# Altium footprint library Inductors.PcbLib: 70 footprints (part 5 of 5)
Each footprint in its own frame and in the unit in brackets; x right, y up, seen from the top. Pads: shape width x height; smd on the part's side, far side on the other; paste and mask are expansions set on the pad; w line width, h text height; cw(c..) or ccw(c..) is an arc to the next point about the centre after c.
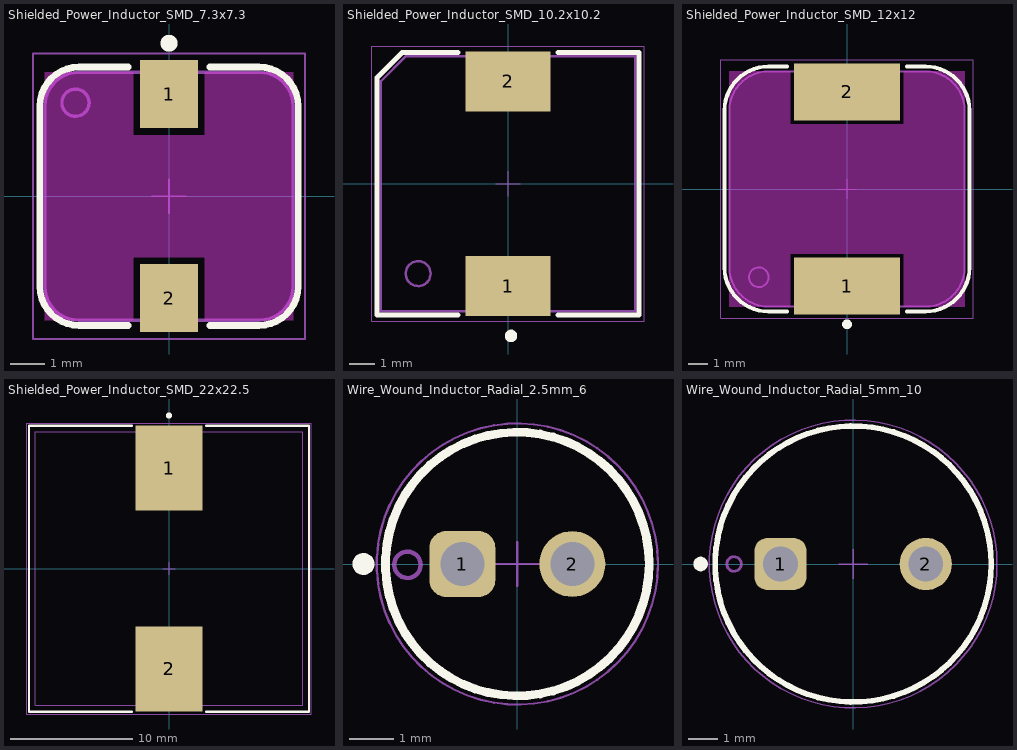
[diagram p4: the footprints below, top view; thin cyan lines are the x and y axes]

## Shielded_Power_Inductor_SMD_7.3x7.3 [mm]
height 3.2
pads (2):
  rect 1.7x2 smd: 1(0,3) 2(0,-3)
Top Layer keep-out:
  region: 3.65,-3.65 1.05,-3.65 1.05,-1.8 -1.05,-1.8 -1.05,-3.65 -3.65,-3.65 -3.65,3.65 -1.05,3.65 -1.05,1.8 1.05,1.8 1.05,3.65 3.65,3.65
Top Overlay:
  circle w0.25: c0,4.5 r0.125
  lines w0.2: -1.2,-3.8 -2.65,-3.8 cw(c-2.65,-2.65) -3.8,-2.65 -3.8,2.65 cw(c-2.65,2.65) -2.65,3.8 -1.2,3.8 ; 1.2,-3.8 2.65,-3.8 ccw(c2.65,-2.65) 3.8,-2.65 3.8,2.65 ccw(c2.65,2.65) 2.65,3.8 1.2,3.8
Top Component Outline:
  circle w0.1: c-2.75,2.75 r0.4
  lines w0.1: -3.65,-2.65 ccw(c-2.65,-2.65) -2.65,-3.65 2.65,-3.65 ccw(c2.65,-2.65) 3.65,-2.65 3.65,2.65 ccw(c2.65,2.65) 2.65,3.65 -2.65,3.65 ccw(c-2.65,2.65) -3.65,2.65 -3.65,-2.65
Top 3D Body:
  circle w0.1: c-2.75,2.75 r0.4
  lines w0.1: -3.65,-2.65 ccw(c-2.65,-2.65) -2.65,-3.65 2.65,-3.65 ccw(c2.65,-2.65) 3.65,-2.65 3.65,2.65 ccw(c2.65,2.65) 2.65,3.65 -2.65,3.65 ccw(c-2.65,2.65) -3.65,2.65 -3.65,-2.65
Top Courtyard:
  lines w0.05: -0.5,0 0.5,0 ; 0,-0.5 0,0.5 ; -4,-4.2 -4,4.2 4,4.2 4,-4.2 -4,-4.2
3D body "WE-PD_7332_p-base_7447789xx.stp": height 3.22, standoff 0.02, extent -3.65,-3.65 3.65,3.65

## Shielded_Power_Inductor_SMD_10.2x10.2 [mm]
height 6.4
pads (2):
  rect 3.4x2.4 smd: 1(0,-4.1) 2(0,4.1)
Top Overlay:
  circle w0.25: c0.12,-6.096 r0.125
  lines w0.2: -2,-5.25 -5.25,-5.25 -5.25,4.25 -4.25,5.25 -2,5.25 ; 2,-5.25 5.25,-5.25 5.25,5.25 2,5.25
Top Component Outline:
  circle w0.1: c-3.6,-3.6 r0.5
  lines w0.1: -5.1,-5.1 5.1,-5.1 5.1,5.1 -4.1,5.1 -5.1,4.1 -5.1,-5.1
Top 3D Body:
  circle w0.1: c-3.6,-3.6 r0.5
  lines w0.1: -5.1,-5.1 5.1,-5.1 5.1,5.1 -4.1,5.1 -5.1,4.1 -5.1,-5.1
Top Courtyard:
  lines w0.05: -0.5,0 0.5,0 ; 0,-0.5 0,0.5 ; -5.45,-5.5 -5.45,5.5 5.45,5.5 5.45,-5.5 -5.45,-5.5
3D body "7447798xxx.stp": height 6.4, standoff 0, extent -5.1,-5.1 5.1,5.1

## Shielded_Power_Inductor_SMD_12x12 [mm]
height 6
pads (2):
  rect 5.4x2.9 smd: 1(0,-4.95) 2(0,4.95)
Top Layer keep-out:
  region: -6,6 -2.9,6 -2.9,3.3 2.9,3.3 2.9,6 6,6 6,-6 2.9,-6 2.9,-3.3 -2.9,-3.3 -2.9,-6 -6,-6
Top Overlay:
  circle w0.25: c0,-6.9 r0.125
  lines w0.2: -3.05,-6.25 -4,-6.25 cw(c-4,-4) -6.25,-4 -6.25,4 cw(c-4,4) -4,6.25 -3.05,6.25 ; 3.05,-6.25 4,-6.25 ccw(c4,-4) 6.25,-4 6.25,4 ccw(c4,4) 4,6.25 3.05,6.25
Top Component Outline:
  circle w0.1: c-4.5,-4.5 r0.5
  lines w0.1: -6,-4 ccw(c-4,-4) -4,-6 4,-6 ccw(c4,-4) 6,-4 6,4 ccw(c4,4) 4,6 -4,6 ccw(c-4,4) -6,4 -6,-4
Top 3D Body:
  circle w0.1: c-4.5,-4.5 r0.5
  lines w0.1: -6,-4 ccw(c-4,-4) -4,-6 4,-6 ccw(c4,-4) 6,-4 6,4 ccw(c4,4) 4,6 -4,6 ccw(c-4,4) -6,4 -6,-4
Top Courtyard:
  lines w0.05: -0.5,0 0.5,0 ; 0,-0.5 0,0.5 ; -6.45,-6.6 -6.45,6.6 6.45,6.6 6.45,-6.6 -6.45,-6.6
3D body "WE-PD_1260_m-base_744771xxx.stp": height 5.66, standoff 0, extent -6,-6 6,6

## Shielded_Power_Inductor_SMD_22x22.5 [mm]
height 12
pads (2):
  rect 5.5x7 smd: 1(0,8.25) 2(0,-8.25)
Top Overlay:
  circle w0.25: c-0.007,12.573 r0.125
  lines w0.2: -3.05,-11.75 -11.5,-11.75 -11.5,11.75 -3.05,11.75 ; 3.05,-11.75 11.5,-11.75 11.5,11.75 3.05,11.75
Top Component Outline:
  lines w0.1: -11,-11.25 11,-11.25 11,11.25 -11,11.25 -11,-11.25
Top 3D Body:
  lines w0.1: -11,-11.25 11,-11.25 11,11.25 -11,11.25 -11,-11.25
Top Courtyard:
  lines w0.05: -0.5,0 0.5,0 ; 0,-0.5 0,0.5 ; -11.7,-11.95 -11.7,11.95 11.7,11.95 11.7,-11.95 -11.7,-11.95
3D body "7443558xxxx.stp": height 12, standoff 0, extent -11,-11.25 11,11.25

## Wire_Wound_Inductor_Radial_2.5mm_6 [mm]
height 8.5
pads (2):
  rrect50% 1.5x1.5 hole 1: 1(-1.25,0)
  round 1.5 hole 1: 2(1.25,0)
Top Overlay:
  circle w0.2: c0,0 r3
  circle w0.25: c-3.5,0 r0.125
Top Component Center:
  lines w0.05: -0.5,0 0.5,0 ; 0,-0.5 0,0.5
Top Component Outline:
  circle w0.1: c-2.5,-0.019 r0.3
  circle w0.1: c0,0 r3
Top Courtyard:
  circle w0.05: c0,0 r3.2
3D body "STEP-WE-TI-5075-rev1.stp": height 7.63, standoff -3.47, extent -2.45,-2.449 2.45,2.449

## Wire_Wound_Inductor_Radial_5mm_10 [mm]
height 8
pads (2):
  rrect50% 1.8x1.8 hole 1.2: 1(-2.5,0)
  round 1.8 hole 1.2: 2(2.5,0)
Top Overlay:
  circle w0.2: c0,0 r4.75
  circle w0.25: c-5.25,0 r0.125
Top Component Center:
  lines w0.05: -0.5,0 0.5,0 ; 0,-0.5 0,0.5
Top Component Outline:
  circle w0.1: c0,0 r4.75
  circle w0.1: c-4.1,0 r0.25
Top Courtyard:
  circle w0.05: c0,0 r4.95
3D body "STEP-WE-TI-8075_HST-rev1.stp": height 7.75, standoff -4.95, extent -4.1,-4.1 4.1,4.1